# Altium footprint library domino-rising-cage-clamp.PcbLib: 435 footprints (part 1 of 28)
Each footprint in its own frame and in the unit in brackets; x right, y up, seen from the top. Pads: shape width x height; smd on the part's side, far side on the other; paste and mask are expansions set on the pad; w line width, h text height; cw(c..) or ccw(c..) is an arc to the next point about the centre after c.
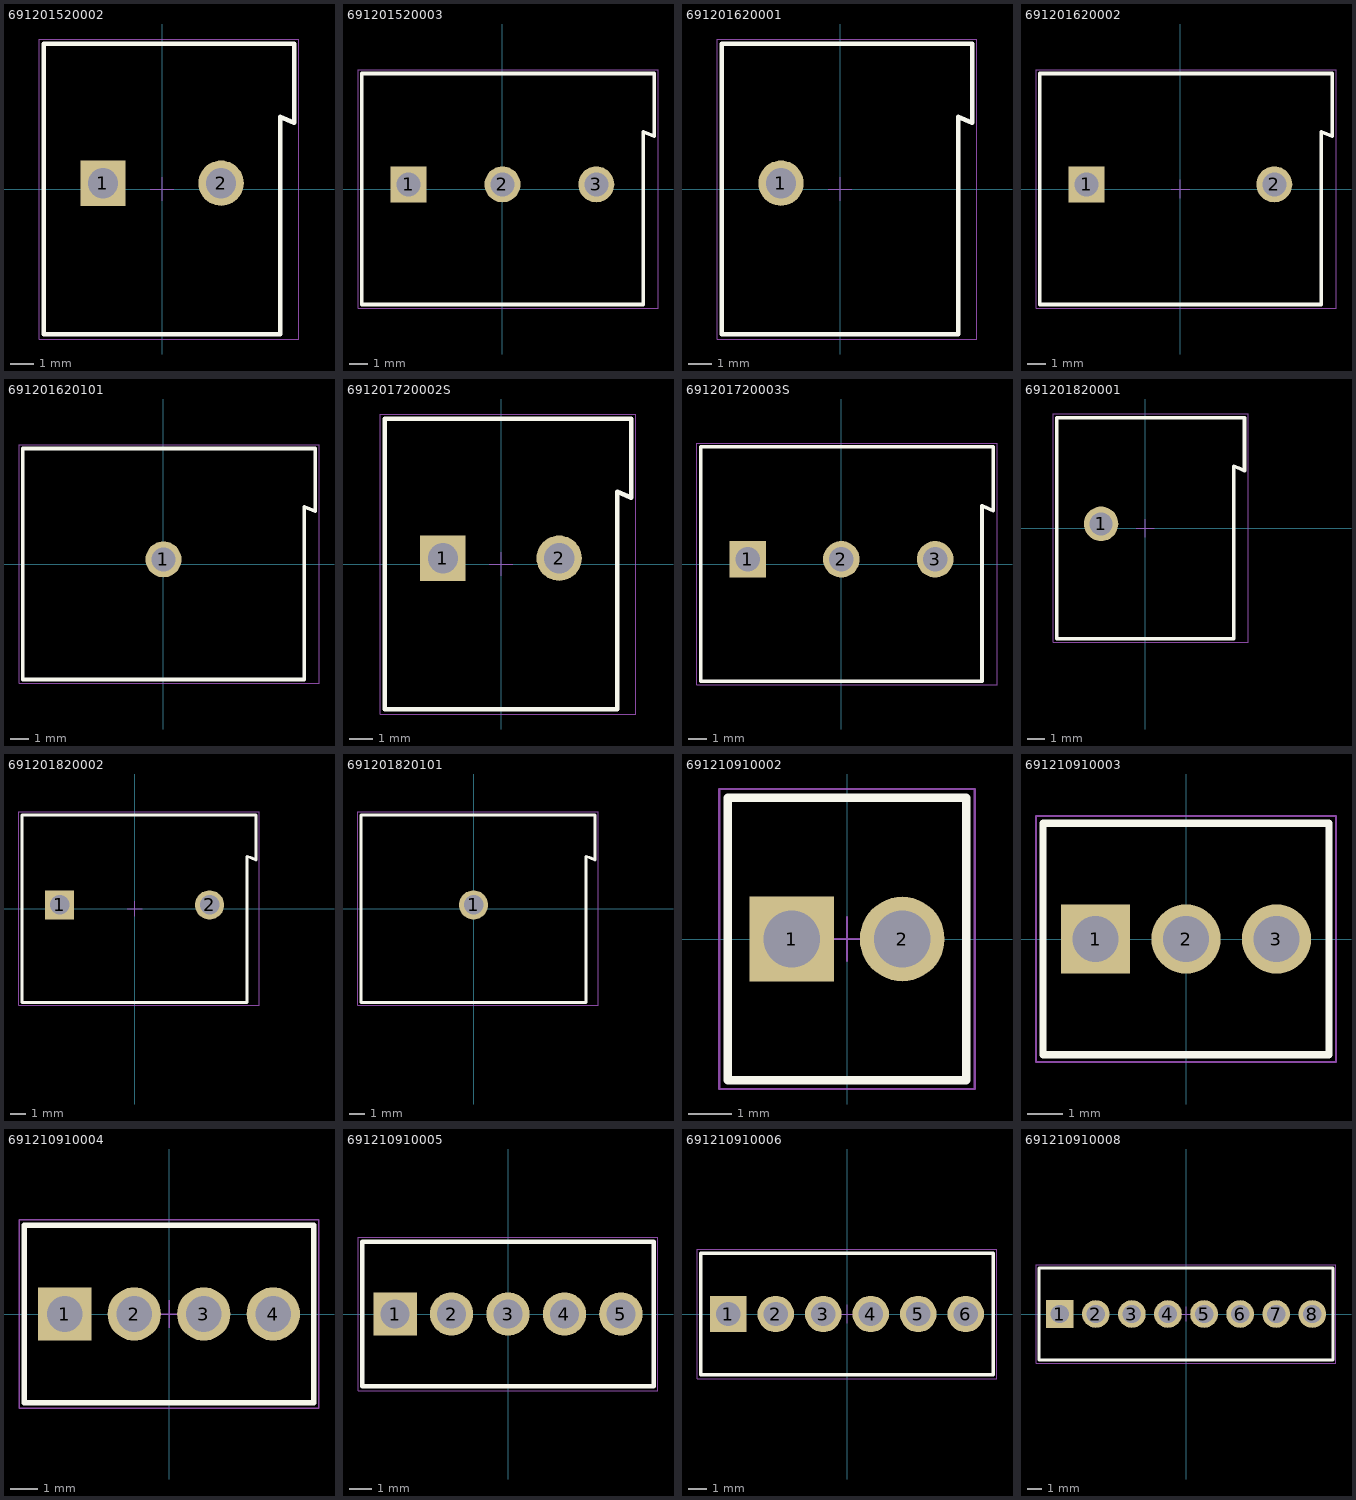
[diagram p0: the footprints below, top view; thin cyan lines are the x and y axes]

## 691201520002 [mm] "Serie 2015 - 5.08 mm _ 2 pins"
height 12
pads (2):
  rect 1.95x1.95 hole 1.3: 1(-2.54,0.25)
  round 1.95 hole 1.3: 2(2.54,0.25)
Top Overlay:
  lines w0.2: -5.08,-6.25 5.08,-6.25 5.08,3.1 5.68,2.85 5.68,6.25 -5.08,6.25 -5.08,-6.25
Mechanical 13:
  lines w0.1: -5.08,-6.25 -5.08,6.25 5.68,6.25 5.68,2.85 5.08,3.1 5.08,-6.25 -5.08,-6.25
Mechanical 15:
  lines w0.05: -0.5,0 0.5,0 ; 0,-0.5 0,0.5 ; -5.28,-6.45 -5.28,6.45 5.88,6.45 5.88,-6.45 -5.28,-6.45
3D body "691201520002.stp": height 12.1, standoff -4.4, extent -5.08,-6.25 5.68,6.25

## 691201520003 [mm] "Serie 2015 - 5.08 mm _ 3 pins"
height 12
pads (3):
  rect 1.95x1.95 hole 1.3: 1(-5.08,0.25)
  round 1.95 hole 1.3: 2(0,0.25) 3(5.08,0.25)
Top Overlay:
  lines w0.2: -7.62,-6.25 -7.62,6.25 8.22,6.25 8.22,2.85 7.62,3.1 7.62,-6.25 -7.62,-6.25
Mechanical 13:
  lines w0.1: -7.62,-6.25 7.62,-6.25 7.62,3.1 8.22,2.85 8.22,6.25 -7.62,6.25 -7.62,-6.25
Mechanical 15:
  lines w0.05: -0.5,0 0.5,0 ; 0,-0.5 0,0.5 ; -7.82,-6.45 8.42,-6.45 8.42,6.45 -7.82,6.45 -7.82,-6.45
3D body "691201520003.stp": height 12.1, standoff -4.4, extent -7.62,-6.25 8.22,6.25

## 691201620001 [mm] "45¡ã Cable Entry with Rising Cage Clamp, pitch 10.16mm, 01p"
height 12
pads (1):
  round 1.95 hole 1.3: 1(-2.54,0.25)
Top Overlay:
  lines w0.2: 5.68,2.85 5.68,6.25 -5.08,6.25 -5.08,-6.25 5.08,-6.25 5.08,3.1 5.681,2.852
Mechanical 13:
  lines w0.1: 5.68,2.85 5.68,6.25 -5.08,6.25 -5.08,-6.25 5.08,-6.25 5.08,3.1 5.681,2.852
Mechanical 15:
  lines w0.05: -0.5,0 0.5,0 ; 0,-0.5 0,0.5 ; -5.28,-6.45 -5.28,6.45 5.88,6.45 5.88,-6.45 -5.28,-6.45
3D body "691201620001.stp": height 12.1, standoff -4.4, extent -5.08,-6.25 5.68,6.25

## 691201620002 [mm] "45¡ã Cable Entry with Rising Cage Clamp, pitch 10.16mm, 02p"
height 12
pads (2):
  rect 1.95x1.95 hole 1.3: 1(-5.08,0.25)
  round 1.95 hole 1.3: 2(5.08,0.25)
Top Overlay:
  lines w0.2: 8.22,2.85 8.22,6.25 -7.62,6.25 -7.62,-6.25 7.62,-6.25 7.62,3.1 8.221,2.852
Mechanical 13:
  lines w0.1: 8.22,2.85 8.22,6.25 -7.62,6.25 -7.62,-6.25 7.62,-6.25 7.62,3.1 8.221,2.852
Mechanical 15:
  lines w0.05: -0.5,0 0.5,0 ; 0,-0.5 0,0.5 ; -7.82,-6.45 -7.82,6.45 8.42,6.45 8.42,-6.45 -7.82,-6.45
3D body "691201620002.stp": height 12.1, standoff -4.4, extent -7.62,-6.25 8.22,6.25

## 691201620101 [mm] "45¡ã Cable Entry with Rising Cage Clamp, pitch 10.16mm, 01p"
height 12
pads (1):
  round 1.95 hole 1.3: 1(0,0.25)
Top Overlay:
  lines w0.2: 8.22,2.85 8.22,6.25 -7.62,6.25 -7.62,-6.25 7.62,-6.25 7.62,3.1 8.221,2.852
Mechanical 13:
  lines w0.1: 8.22,2.85 8.22,6.25 -7.62,6.25 -7.62,-6.25 7.62,-6.25 7.62,3.1 8.221,2.852
Mechanical 15:
  lines w0.05: -0.5,0 0.5,0 ; 0,-0.5 0,0.5 ; -7.82,-6.45 8.42,-6.45 8.42,6.45 -7.82,6.45 -7.82,-6.45
3D body "691201620101.stp": height 12.1, standoff -4.4, extent -7.62,-6.25 8.22,6.25

## 691201720002S [mm] "Serie 201S - 5.00 mm _ 2 pins"
height 12
pads (2):
  rect 1.95x1.95 hole 1.3: 1(-2.5,0.25)
  round 1.95 hole 1.3: 2(2.5,0.25)
Top Overlay:
  lines w0.2: -5,-6.25 5,-6.25 5,3.1 5.6,2.85 5.6,6.25 -5,6.25 -5,-6.25
Mechanical 13:
  lines w0.1: -5,-6.25 -5,6.25 5.6,6.25 5.6,2.85 5,3.1 5,-6.25 -5,-6.25
Mechanical 15:
  lines w0.05: -0.5,0 0.5,0 ; 0,-0.5 0,0.5 ; -5.2,-6.45 -5.2,6.45 5.8,6.45 5.8,-6.45 -5.2,-6.45
3D body "691201720002S.stp": height 12.1, standoff -4.4, extent -5,-6.3 5.6,6.2

## 691201720003S [mm] "Serie 201S - 5.00 mm _ 3 pins"
height 12
pads (3):
  rect 1.95x1.95 hole 1.3: 1(-5,0.25)
  round 1.95 hole 1.3: 2(0,0.25) 3(5,0.25)
Top Overlay:
  lines w0.2: -7.5,-6.25 7.5,-6.25 7.5,3.1 8.1,2.85 8.1,6.25 -7.5,6.25 -7.5,-6.25
Mechanical 13:
  lines w0.1: -7.5,-6.25 -7.5,6.25 8.1,6.25 8.1,2.85 7.5,3.1 7.5,-6.25 -7.5,-6.25
Mechanical 15:
  lines w0.05: -0.5,0 0.5,0 ; 0,-0.5 0,0.5 ; -7.7,-6.45 -7.7,6.45 8.3,6.45 8.3,-6.45 -7.7,-6.45
3D body "691201720003S.stp": height 12.1, standoff -4.4, extent -7.5,-6.3 8.1,6.2

## 691201820001 [mm] "45¡ã Cable Entry with Rising Cage Clamp, pitch 10mm, 01p"
height 12
pads (1):
  round 1.95 hole 1.3: 1(-2.5,0.25)
Top Overlay:
  lines w0.2: 4.998,-6.248 4.998,3.494 cw(c2.595,-3.291) 5.6,3.25 5.6,6.25 -5,6.25 -5,-6.25 5,-6.25
Mechanical 13:
  lines w0.1: 4.998,-6.248 4.998,3.494 cw(c2.595,-3.291) 5.6,3.25 5.6,6.25 -5,6.25 -5,-6.25 5,-6.25
Mechanical 15:
  lines w0.05: -0.5,0 0.5,0 ; 0,-0.5 0,0.5 ; -5.2,-6.45 -5.2,6.45 5.8,6.45 5.8,-6.45 -5.2,-6.45
3D body "691201820001.stp": height 12.1, standoff -4.4, extent -5,-6.25 5.6,6.25

## 691201820002 [mm] "45¡ã Cable Entry with Rising Cage Clamp, pitch 10mm, 02p"
height 12
pads (2):
  rect 1.95x1.95 hole 1.3: 1(-5,0.25)
  round 1.95 hole 1.3: 2(5,0.25)
Top Overlay:
  lines w0.2: 7.498,3.494 cw(c5.095,-3.291) 8.1,3.25 8.1,6.25 -7.5,6.25 -7.5,-6.25 7.5,-6.25 7.5,3.494
Mechanical 13:
  lines w0.1: 7.498,3.494 cw(c5.095,-3.291) 8.1,3.25 8.1,6.25 -7.5,6.25 -7.5,-6.25 7.5,-6.25 7.5,3.494
Mechanical 15:
  lines w0.05: -0.5,0 0.5,0 ; 0,-0.5 0,0.5 ; -7.7,-6.45 -7.7,6.45 8.3,6.45 8.3,-6.45 -7.7,-6.45
3D body "691201820002.stp": height 12.1, standoff -4.4, extent -7.5,-6.25 8.1,6.25

## 691201820101 [mm] "45¡ã Cable Entry with Rising Cage Clamp, pitch 10mm, 01p"
height 12
pads (1):
  round 1.95 hole 1.3: 1(0,0.25)
Top Overlay:
  lines w0.2: 7.498,3.494 cw(c5.095,-3.291) 8.1,3.25 8.1,6.25 -7.5,6.25 -7.5,-6.25 7.5,-6.25 7.5,3.494
Mechanical 13:
  lines w0.1: 7.498,3.494 cw(c5.095,-3.291) 8.1,3.25 8.1,6.25 -7.5,6.25 -7.5,-6.25 7.5,-6.25 7.5,3.494
Mechanical 15:
  lines w0.05: -0.5,0 0.5,0 ; 0,-0.5 0,0.5 ; -7.7,-6.45 8.3,-6.45 8.3,6.45 -7.7,6.45 -7.7,-6.45
3D body "691201820101.stp": height 12.1, standoff -4.4, extent -7.5,-6.25 8.1,6.25

## 691210910002 [mm] "2,54mm - modular - green - Horizontal wire entry - Cage clamp - 0,8mm2 wires - 02p"
height 8.5
pads (2):
  rect 1.95x1.95 hole 1.3: 1(-1.27,0)
  round 1.95 hole 1.3: 2(1.27,0)
Top Overlay:
  lines w0.2: -2.74,-3.25 -2.74,3.25 2.74,3.25 2.74,-3.25 -2.74,-3.25
Mechanical 13:
  lines w0.1: -2.74,-3.25 2.74,-3.25 2.74,3.25 -2.74,3.25 -2.74,-3.25
Mechanical 15:
  lines w0.05: -0.5,0 0.5,0 ; 0,-0.5 0,0.5 ; -2.94,-3.45 2.94,-3.45 2.94,3.45 -2.94,3.45 -2.94,-3.45
3D body "691210910002.stp": height 8.55, standoff -3.45, extent -2.74,-3.25 2.74,3.25

## 691210910003 [mm] "2,54mm - modular - green - Horizontal wire entry - Cage clamp - 0,8mm2 wires - 03p"
height 8.5
pads (3):
  rect 1.95x1.95 hole 1.3: 1(-2.54,0)
  round 1.95 hole 1.3: 2(0,0) 3(2.54,0)
Top Overlay:
  lines w0.2: -4.01,-3.25 -4.01,3.25 4.01,3.25 4.01,-3.25 -4.01,-3.25
Mechanical 13:
  lines w0.1: -4.01,-3.25 4.01,-3.25 4.01,3.25 -4.01,3.25 -4.01,-3.25
Mechanical 15:
  lines w0.05: -0.5,0 0.5,0 ; 0,-0.5 0,0.5 ; -4.21,-3.45 4.21,-3.45 4.21,3.45 -4.21,3.45 -4.21,-3.45
3D body "691210910003.stp": height 8.55, standoff -3.45, extent -4.01,-3.25 4.01,3.25

## 691210910004 [mm] "2,54mm - modular - green - Horizontal wire entry - Cage clamp - 0,8mm2 wires - 04p"
height 8.5
pads (4):
  rect 1.95x1.95 hole 1.3: 1(-3.81,0)
  round 1.95 hole 1.3: 2(-1.27,0) 3(1.27,0) 4(3.81,0)
Top Overlay:
  lines w0.2: -5.28,-3.25 -5.28,3.25 5.28,3.25 5.28,-3.25 -5.28,-3.25
Mechanical 13:
  lines w0.1: -5.28,-3.25 5.28,-3.25 5.28,3.25 -5.28,3.25 -5.28,-3.25
Mechanical 15:
  lines w0.05: -0.5,0 0.5,0 ; 0,-0.5 0,0.5 ; -5.48,-3.45 5.48,-3.45 5.48,3.45 -5.48,3.45 -5.48,-3.45
3D body "691210910004.stp": height 8.55, standoff -3.45, extent -5.28,-3.25 5.28,3.25

## 691210910005 [mm] "2,54mm - modular - green - Horizontal wire entry - Cage clamp - 0,8mm2 wires - 05p"
height 8.5
pads (5):
  rect 1.95x1.95 hole 1.3: 1(-5.08,0)
  round 1.95 hole 1.3: 2(-2.54,0) 3(0,0) 4(2.54,0) 5(5.08,0)
Top Overlay:
  lines w0.2: -6.55,-3.25 6.55,-3.25 6.55,3.25 -6.55,3.25 -6.55,-3.25
Mechanical 13:
  lines w0.1: -6.55,-3.25 -6.55,3.25 6.55,3.25 6.55,-3.25 -6.55,-3.25
Mechanical 15:
  lines w0.05: -0.5,0 0.5,0 ; 0,-0.5 0,0.5 ; -6.75,-3.45 -6.75,3.45 6.75,3.45 6.75,-3.45 -6.75,-3.45
3D body "691210910005.stp": height 8.55, standoff -3.45, extent -6.55,-3.25 6.55,3.25

## 691210910006 [mm] "2,54mm - modular - green - Horizontal wire entry - Cage clamp - 0,8mm2 wires - 06p"
height 8.5
pads (6):
  rect 1.95x1.95 hole 1.3: 1(-6.35,0)
  round 1.95 hole 1.3: 2(-3.81,0) 3(-1.27,0) 4(1.27,0) 5(3.81,0) 6(6.35,0)
Top Overlay:
  lines w0.2: -7.82,-3.25 -7.82,3.25 7.82,3.25 7.82,-3.25 -7.82,-3.25
Mechanical 13:
  lines w0.1: -7.82,-3.25 7.82,-3.25 7.82,3.25 -7.82,3.25 -7.82,-3.25
Mechanical 15:
  lines w0.05: -0.5,0 0.5,0 ; 0,-0.5 0,0.5 ; -8.02,-3.45 8.02,-3.45 8.02,3.45 -8.02,3.45 -8.02,-3.45
3D body "691210910006.stp": height 8.55, standoff -3.45, extent -7.82,-3.25 7.82,3.25

## 691210910008 [mm] "2,54mm - modular - green - Horizontal wire entry - Cage clamp - 0,8mm2 wires - 08p"
height 8.5
pads (8):
  rect 1.95x1.95 hole 1.3: 1(-8.89,0)
  round 1.95 hole 1.3: 2(-6.35,0) 3(-3.81,0) 4(-1.27,0) 5(1.27,0) 6(3.81,0) 7(6.35,0) 8(8.89,0)
Top Overlay:
  lines w0.2: -10.36,-3.25 -10.36,3.25 10.36,3.25 10.36,-3.25 -10.36,-3.25
Mechanical 13:
  lines w0.1: -10.36,-3.25 10.36,-3.25 10.36,3.25 -10.36,3.25 -10.36,-3.25
Mechanical 15:
  lines w0.05: -0.5,0 0.5,0 ; 0,-0.5 0,0.5 ; -10.56,-3.45 10.56,-3.45 10.56,3.45 -10.56,3.45 -10.56,-3.45
3D body "691210910008.stp": height 8.55, standoff -3.45, extent -10.36,-3.25 10.36,3.25